# Altium footprint library Boris_IO.PcbLib: 57 footprints (part 2 of 4)
Each footprint in its own frame and in the unit in brackets; x right, y up, seen from the top. Pads: shape width x height; smd on the part's side, far side on the other; paste and mask are expansions set on the pad; w line width, h text height; cw(c..) or ccw(c..) is an arc to the next point about the centre after c.
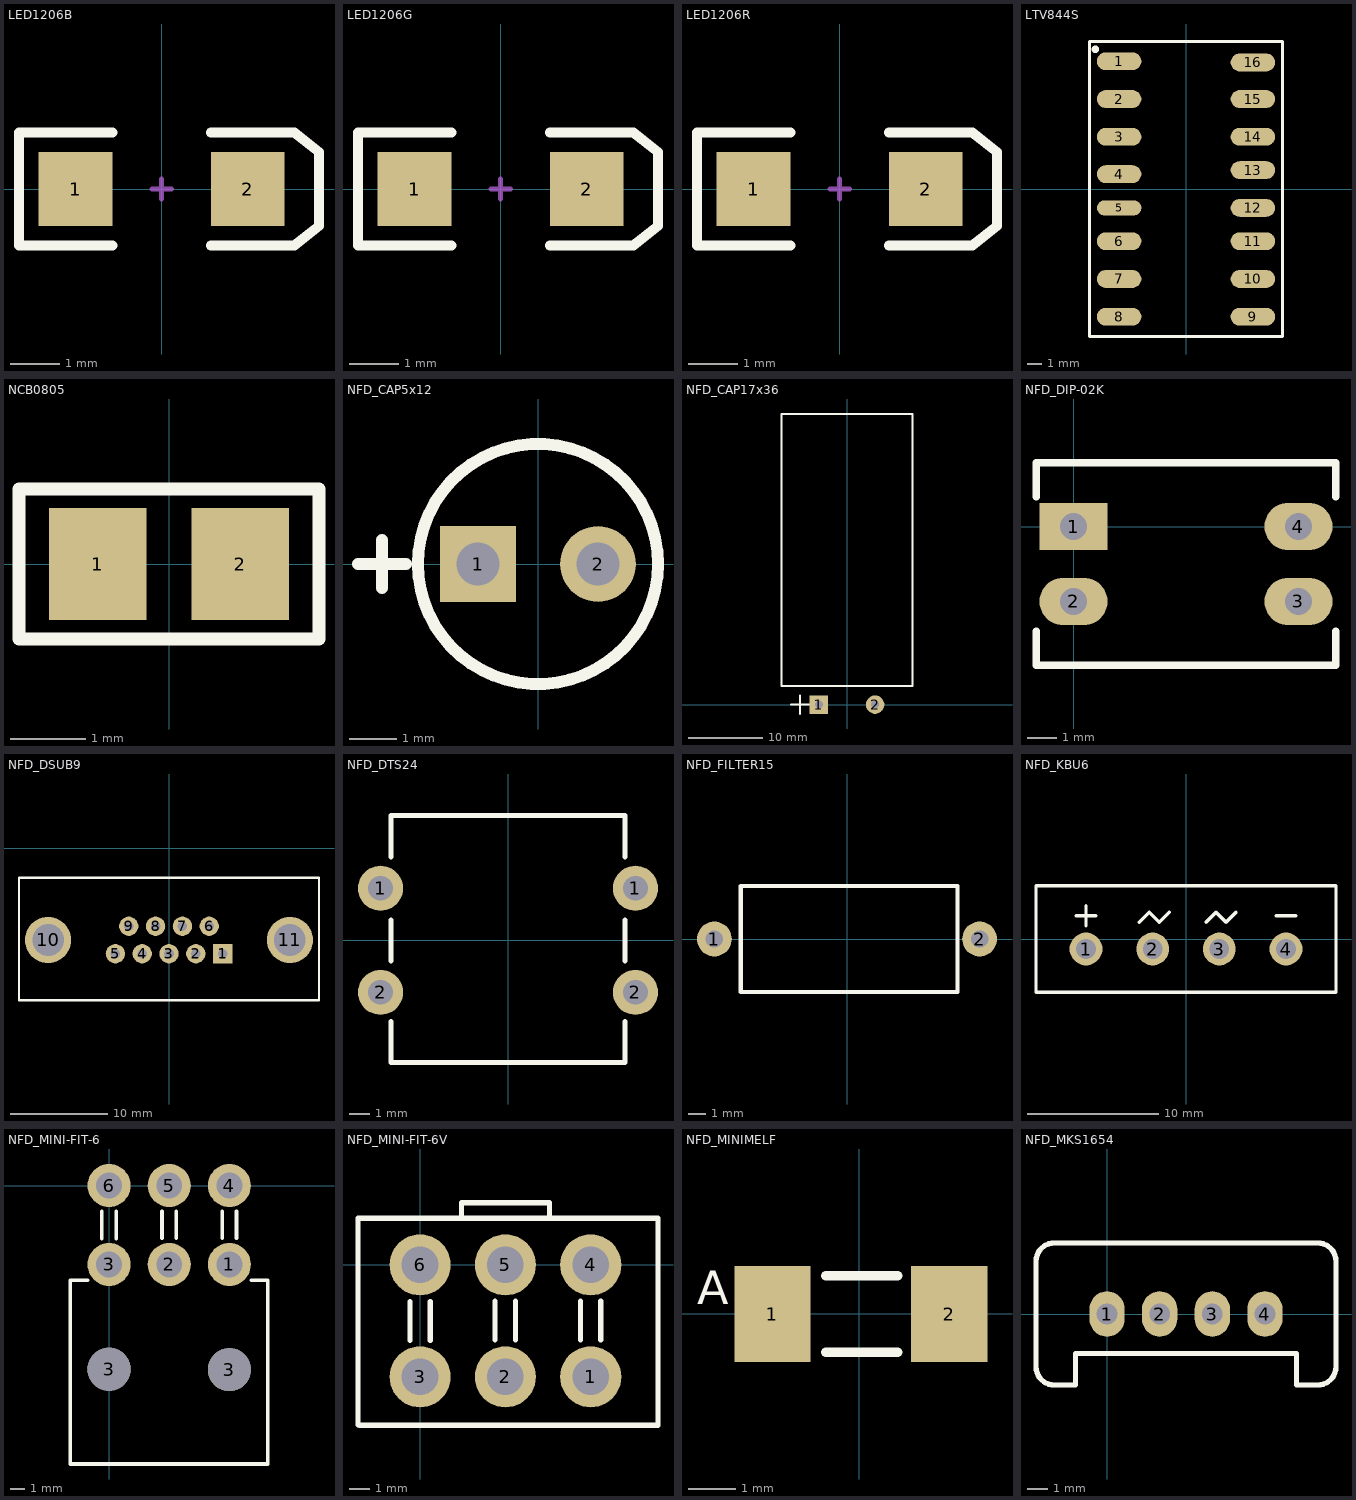
[diagram p1: the footprints below, top view; thin cyan lines are the x and y axes]

## LED1206B [mm] "SMT LED; 2 Flat Leads"
height 1.2
pads (2):
  rect 1.5x1.5 smd: 1(-1.75,0) 2(1.75,0)
Top Overlay:
  lines w0.2: -1,-1.15 -2.9,-1.15 -2.9,1.15 -1,1.15 ; 1,-1.15 2.7,-1.15 3.2,-0.75 3.2,0.75 2.7,1.15 1,1.15
Mechanical 1:
  lines w0.1: -0.2,0 0.2,0 ; 0,-0.2 0,0.2
3D body: height 0.58, standoff 0, extent -1.6,-0.8 1.6,0.8
3D body: height 0.8, standoff 0.2, extent -0.9,-0.8 0.9,0.8

## LED1206G [mm] "SMT LED; 2 Flat Leads"
height 1.2
pads (2):
  rect 1.5x1.5 smd: 1(-1.75,0) 2(1.75,0)
Top Overlay:
  lines w0.2: -1,-1.15 -2.9,-1.15 -2.9,1.15 -1,1.15 ; 1,-1.15 2.7,-1.15 3.2,-0.75 3.2,0.75 2.7,1.15 1,1.15
Mechanical 1:
  lines w0.1: -0.2,0 0.2,0 ; 0,-0.2 0,0.2
3D body: height 0.58, standoff 0, extent -1.6,-0.8 1.6,0.8
3D body: height 0.8, standoff 0.2, extent -0.9,-0.8 0.9,0.8

## LED1206R [mm] "SMT LED; 2 Flat Leads"
height 1.2
pads (2):
  rect 1.5x1.5 smd: 1(-1.75,0) 2(1.75,0)
Top Overlay:
  lines w0.2: -1,-1.15 -2.9,-1.15 -2.9,1.15 -1,1.15 ; 1,-1.15 2.7,-1.15 3.2,-0.75 3.2,0.75 2.7,1.15 1,1.15
Mechanical 1:
  lines w0.1: -0.2,0 0.2,0 ; 0,-0.2 0,0.2
3D body: height 0.8, standoff 0.2, extent -0.9,-0.8 0.9,0.8
3D body: height 0.58, standoff 0, extent -1.6,-0.8 1.6,0.8

## LTV844S [mm]
height 1.75
pads (16):
  oval 3x1.2 smd: 1(-4.5,8.59) 2(-4.5,6.05) 3(-4.5,3.51) 4(-4.5,1) 6(-4.5,-3.51) 7(-4.5,-6.05) 8(-4.5,-8.59) 9(4.5,-8.59) 10(4.5,-6.05) 11(4.5,-3.51) 12(4.5,-1.27) 13(4.5,1.27) 14(4.5,3.51) 15(4.5,6.05) 16(4.5,8.51)
  oval 3x1 smd: 5(-4.5,-1.27)
Top Overlay:
  circle w0.25: c-6.1,9.398 r0.125
  lines w0.2: -6.5,-9.92 6.5,-9.92 6.5,9.92 -6.5,9.92 -6.5,-9.92

## NCB0805 [mm] "Chip Capacitor; Body 2.0 x 1.2 mm (LxW typ)"
height 1.3
pads (2):
  rect 1.3x1.5 smd: 1(-0.95,0) 2(0.95,0)
Top Overlay:
  lines w0.17: -2,-1 -2,1 2,1 2,-1 -2,-1

## NFD_CAP5x12 [mm]
pads (2):
  rect 1.6x1.6 hole 0.9: 1(-1.27,0)
  round 1.6 hole 0.9: 2(1.27,0)
Top Overlay:
  circle w0.254: c0,0 r2.54
  lines w0.254: -3.81,0 -2.794,0 ; -3.302,-0.508 -3.302,0.508
3D body: height 13.2, standoff -1.9, extent -2.54,-2.539 2.538,2.54

## NFD_CAP17x36 [mm]
pads (2):
  rect 2.5x2.5 hole 1.1: 1(-3.81,0)
  round 2.5 hole 1.1: 2(3.81,0)
Top Overlay:
  lines w0.254: -7.62,0 -5.08,0 ; -6.35,-1.27 -6.35,1.27 ; -8.89,2.54 0,2.54 8.89,2.54 8.89,39.37 -8.89,39.37 -8.89,2.54
3D body: height 15.98, standoff 0, extent -7.997,2.094 7.997,39.594

## NFD_DIP-02K [mm]
pads (4):
  rect 2.3x1.6 hole 0.9: 1(0,0)
  oval 2.3x1.6 hole 0.9: 2(0,-2.54) 3(7.62,-2.54) 4(7.62,0)
Top Overlay:
  lines w0.254: -1.27,-3.556 -1.27,-4.699 8.89,-4.699 8.89,-3.556 ; -1.27,1.016 -1.27,2.159 8.89,2.159 8.89,1.016
3D body: height 6.9, standoff -3.2, extent -1.27,-4.683 8.89,2.159

## NFD_DSUB9 [mm] "Connector; D Subminiature; 9 Position; Right Angle; Pitch 1.385 mm"
height 12.75
pads (11):
  rect 2x2 hole 1: 1(5.54,-10.92)
  round 2 hole 1: 2(2.77,-10.92) 3(0,-10.92) 4(-2.77,-10.92) 5(-5.54,-10.92) 6(4.155,-8.08) 7(1.385,-8.08) 8(-1.385,-8.08) 9(-4.155,-8.08)
  round 4.76 hole 3.26: 10(-12.495,-9.5) 11(12.495,-9.5)
Top Overlay:
  lines w0.254: -15.494,-15.748 -15.494,-10.414 -15.494,-3.048 15.494,-3.048 15.494,-5.588 15.494,-15.748 -15.494,-15.748
3D body: height 13.5, standoff -3.7, extent -15.4,-15.648 15.4,-3.148

## NFD_DTS24 [mm]
pads (4):
  round 2.2 hole 1.2: 1(-6.223,2.54) 1(6.223,2.54) 2(-6.223,-2.54) 2(6.223,-2.54)
Top Overlay:
  lines w0.254: -5.715,-3.969 -5.715,-5.969 5.715,-5.969 5.715,-3.969 ; -5.715,-1.016 -5.715,0.984 ; -5.715,4.064 -5.715,6.096 5.715,6.096 5.715,4.064 ; 5.715,-1.016 5.715,0.984
3D body: height 7.4, standoff -3.4, extent -6.5,-5.969 6.5,6.031

## NFD_FILTER15 [mm]
pads (2):
  round 2 hole 1: 1(-7.62,0) 2(7.62,0)
Top Overlay:
  lines w0.254: -6.096,-3.048 -6.096,3.048 6.35,3.048 6.35,-3.048 -6.096,-3.048
3D body: height 6.5, standoff -2.55, extent -7.875,-3.048 7.875,2.952

## NFD_KBU6 [mm]
pads (4):
  round 2.5 hole 1.5: 1(-7.62,-0.762) 2(-2.54,-0.762) 3(2.54,-0.762) 4(7.62,-0.762)
Top Overlay:
  lines w0.254: -8.382,1.778 -6.858,1.778 ; -7.62,1.016 -7.62,2.54 ; -3.556,1.27 -2.794,2.032 -2.032,1.27 -1.27,2.032 ; 1.524,1.27 2.286,2.032 3.048,1.27 3.81,2.032 ; 6.858,1.778 8.382,1.778 ; -11.43,-4.064 11.43,-4.064 11.43,4.064 0.254,4.064 -11.43,4.064 -11.43,-4.064
3D body: height 19.3, standoff -4.5, extent -11.6,-4.312 11.6,4.188

## NFD_MINI-FIT-6 [mm]
pads (8):
  round 3 hole 1.8: 1(8.382,-5.5) 2(4.191,-5.5) 3(0,-5.5) 4(8.382,0) 5(4.191,0) 6(0,0)
  round 3 hole 3: 3(0,-12.8) 3(8.382,-12.827)
Top Overlay:
  lines w0.254: -1.5,-6.6 -2.7,-6.6 -2.7,-19.4 0,-19.4 11.049,-19.4 11.049,-6.6 9.906,-6.6 ; -0.5,-3.7 -0.5,-1.8 ; 0.5,-3.7 0.5,-1.8 ; 3.683,-3.683 3.683,-1.783 ; 4.683,-3.683 4.683,-1.783 ; 7.874,-3.683 7.874,-1.783 ; 8.874,-3.683 8.874,-1.783
3D body: height 11.4, standoff -3.6, extent -2.77,-19.365 11.43,0.569

## NFD_MINI-FIT-6V [mm]
pads (6):
  round 3 hole 1.8: 1(8.382,-5.5) 2(4.191,-5.5) 3(0,-5.5) 4(8.382,0) 5(4.191,0) 6(0,0)
Top Overlay:
  lines w0.254: -3.048,-7.848 -3.048,2.286 3.398,2.286 11.684,2.286 11.684,-7.874 -2.982,-7.874 ; -0.5,-3.7 -0.5,-1.8 ; 0.5,-3.7 0.5,-1.8 ; 2.032,2.286 2.032,3.048 6.35,3.048 6.35,2.286 ; 3.683,-3.683 3.683,-1.783 ; 4.683,-3.683 4.683,-1.783 ; 7.874,-3.683 7.874,-1.783 ; 8.874,-3.683 8.874,-1.783
3D body: height 12.8, standoff -3.5, extent -2.982,-7.848 11.618,3.152

## NFD_MINIMELF [mm] "DO-214-AA/SMB; 2 C-Bend Leads; Body 5.3 x 3.6 mm, inc. leads (LxW)"
height 2.54
pads (2):
  rect 1.6x2 smd: 1(-1.82,0) 2(1.88,0)
Top Overlay:
  lines w0.2: -0.7,-0.8 0.8,-0.8 ; -0.7,0.8 0.8,0.8
  text "A" at -3.4,0.2 h0.7
3D body: height 1.6, standoff 0, extent -1.82,-0.8 1.88,0.8

## NFD_MKS1654 [mm]
pads (4):
  oval 1.7x2.2 hole 1: 1(0,0) 2(2.54,0) 3(5.08,0) 4(7.62,0)
Top Overlay:
  lines w0.254: -3.429,-2.54 ccw(c-2.54,-2.54) -2.54,-3.429 -1.524,-3.429 -1.524,-1.905 9.144,-1.905 9.144,-3.429 10.16,-3.429 ccw(c10.16,-2.54) 11.049,-2.54 11.049,2.54 ccw(c10.16,2.54) 10.16,3.429 -2.54,3.429 ccw(c-2.54,2.54) -3.429,2.54 -3.429,-2.54